# Altium footprint library Sajad_Altium_Library.PcbLib: 380 footprints (part 15 of 24)
Each footprint in its own frame and in the unit in brackets; x right, y up, seen from the top. Pads: shape width x height; smd on the part's side, far side on the other; paste and mask are expansions set on the pad; w line width, h text height; cw(c..) or ccw(c..) is an arc to the next point about the centre after c.
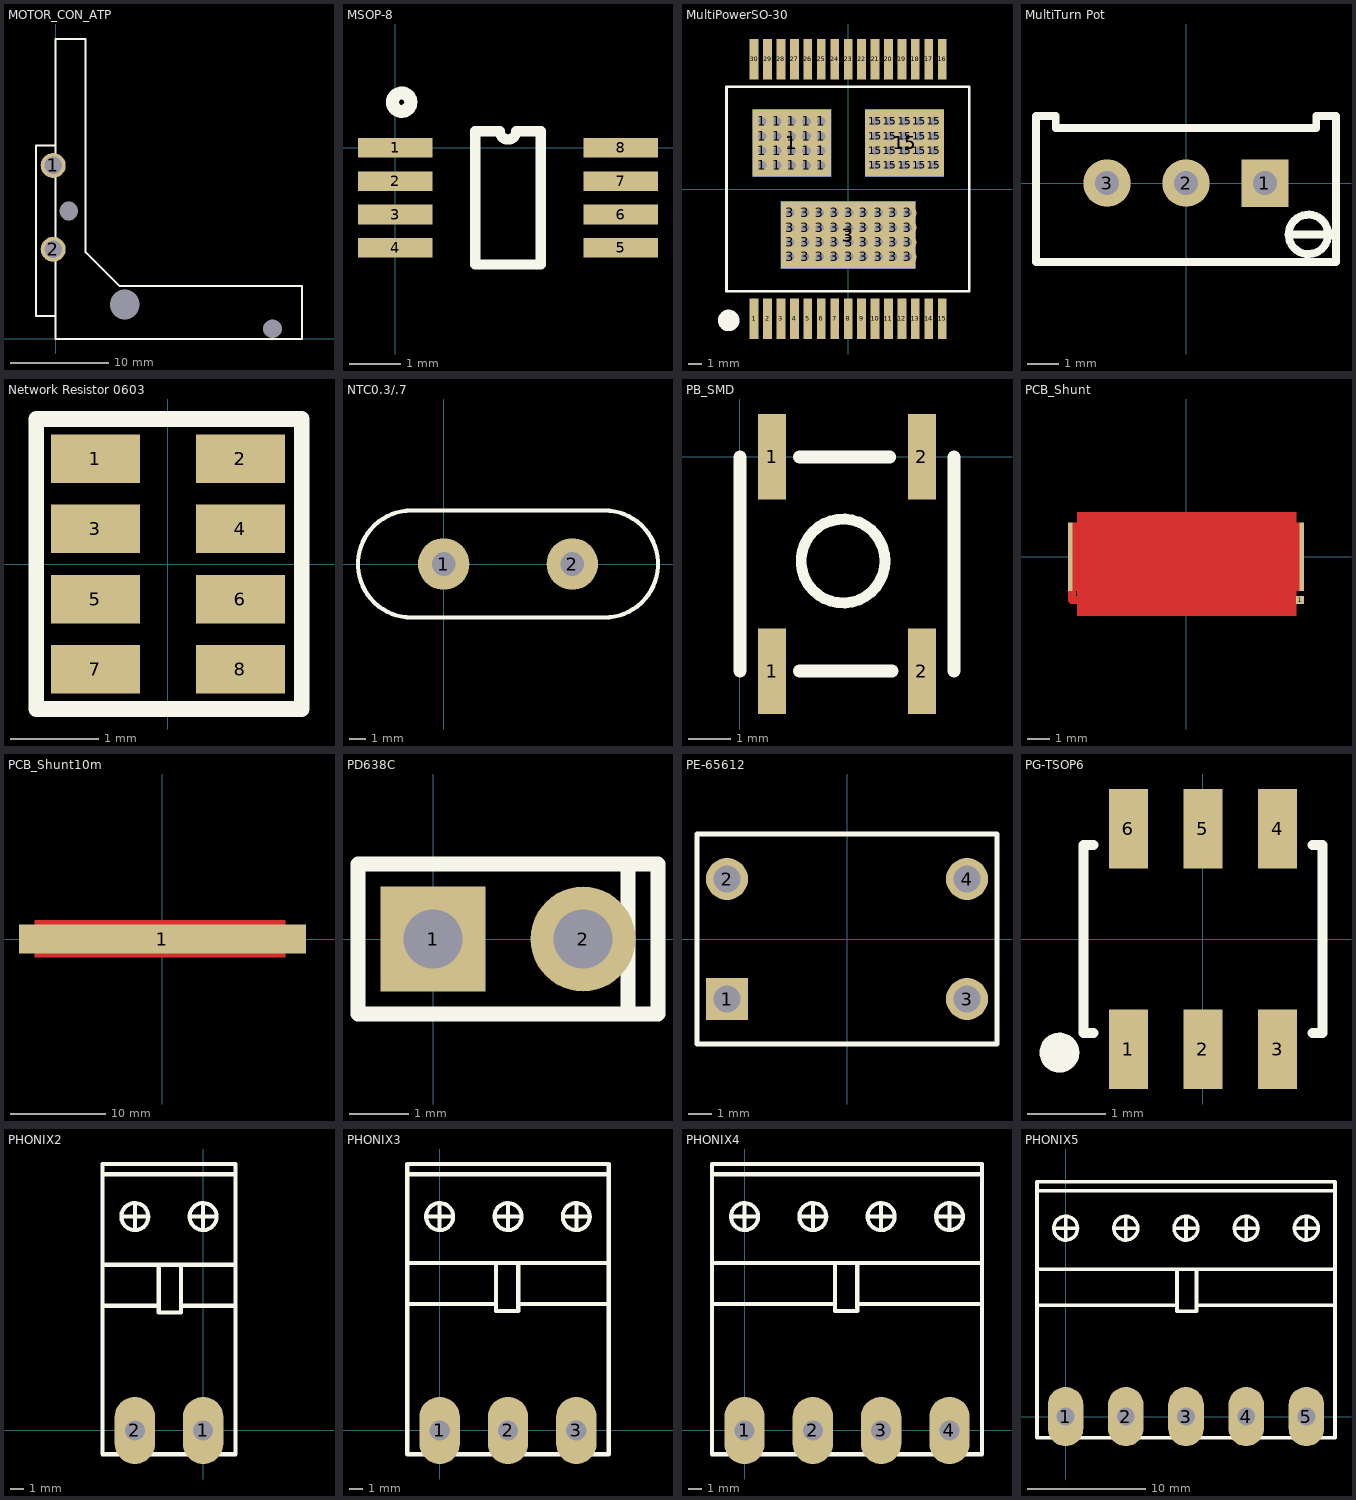
[diagram p14: the footprints below, top view; thin cyan lines are the x and y axes]

## MOTOR_CON_ATP [mm]
pads (5):
  round 0 hole 1.905: 0(1.326,12.975) 0(21.998,1.041)
  round 0 hole 3: 0(7.001,3.5)
  round 2.54 hole 1.778: 1(-0.246,17.6) 2(-0.246,9.1)
Top Overlay:
  lines w0.2: 0.001,2.35 -1.999,2.35 -1.999,19.65 0.001,19.65 ; 23.266,0 23.272,0.006 ; 0.001,0 25.001,0 25.001,5.38 6.457,5.38 3.051,8.786 3.051,30.429 0.001,30.429 0.001,0
3D body: height 16.32, standoff -2.58, extent -0.659,-0.086 25.141,30.414

## MSOP-8 [mil]
pads (8):
  rect 57x15 smd: 1(0,0) 2(0,-25.59) 3(0,-51.18) 4(0,-76.77) 5(173.23,-76.77) 6(173.23,-51.18) 7(173.23,-25.59) 8(173.23,0)
Top Overlay:
  circle w10: c5,35 r7.07
  lines w7.87: 61.42,-89.57 111.81,-89.57 111.81,12.8 93.01,12.8 cw(c86.61,12.8) 80.22,12.8 61.42,12.8 61.42,-89.57

## MultiPowerSO-30 [mil]
pads (112):
  rect 25.59x118.11 smd: 1(-275.59,-380.24) 2(-236.22,-380.24) 3(-196.85,-380.24) 4(-157.48,-380.24) 5(-118.11,-380.24) 6(-78.74,-380.24) 7(-39.37,-380.24) 8(0,-380.24) 9(39.37,-380.24) 10(78.74,-380.24) 11(118.11,-380.24) 12(157.48,-380.24) 13(196.85,-380.24) 14(236.22,-380.24) 15(275.59,-380.24) 16(275.59,380.24) 17(236.22,380.24) 18(196.85,380.24) 19(157.48,380.24) 20(118.11,380.24) 21(78.74,380.24) 22(39.37,380.24) 23(0,380.24) 24(-39.37,380.24) 25(-78.74,380.24) 26(-118.11,380.24) 27(-157.48,380.24) 28(-196.85,380.24) 29(-236.22,380.24) 30(-275.59,380.24)
  round 50 hole 25: 1(-251,69) 1(-251,112) 1(-251,155) 1(-251,198) 1(-208,69) 1(-208,112) 1(-208,155) 1(-208,198) 1(-165,69) 1(-165,112) 1(-165,155) 1(-165,198) 1(-122,69) 1(-122,112) 1(-122,155) 1(-122,198) 1(-79,69) 1(-79,112) 1(-79,155) 1(-79,198) 3(-169,-199) 3(-169,-156) 3(-169,-113) 3(-169,-70) 3(-126,-199) 3(-126,-156) 3(-126,-113) 3(-126,-70) 3(-83,-199) 3(-83,-156) 3(-83,-113) 3(-83,-70) 3(-40,-199) 3(-40,-156) 3(-40,-113) 3(-40,-70) 3(3,-199) 3(3,-156) 3(3,-113) 3(3,-70) 3(46,-199) 3(46,-156) 3(46,-113) 3(46,-70) 3(89,-199) 3(89,-156) 3(89,-113) 3(89,-70) 3(132,-199) 3(132,-156) 3(132,-113) 3(132,-70) 3(175,-199) 3(175,-156) 3(175,-113) 3(175,-70) 15(79,69) 15(79,112) 15(79,155) 15(79,198) 15(122,69) 15(122,112) 15(122,155) 15(122,198) 15(165,69) 15(165,112) 15(165,155) 15(165,198) 15(208,69) 15(208,112) 15(208,155) 15(208,198) 15(251,69) 15(251,112) 15(251,155) 15(251,198)
  rect 230.31x196.85 smd: 1(-165,135) 15(165,135)
  rect 230.31x196.85 smd far side: 1(-165,135) 15(165,135)
  rect 393.7x196.85 smd: 3(0,-135)
  rect 393.7x196.85 smd far side: 3(0,-135)
Top Overlay:
  circle w39.37: c-350,-385 r11.81
  lines w7.87: -356.45,-299.8 -356.45,299.8 ; -355.98,-299.8 355,-299.8 355,299.8 -355.98,299.8
3D body: height 93.41, standoff -3.69, extent -339.33,-374.02 337.84,374.02

## MultiTurn Pot [mil] "MultiTurn Potentiometer"
pads (3):
  rect 60x60 hole 30: 1(100,0)
  round 60 hole 30: 2(0,0) 3(-100,0)
Top Overlay:
  circle w10: c155,-65 r25
  lines w10: 130,-65 175,-65 ; -190,-100 -190,85 -165,85 -165,70 0,70 165,70 165,85 190,85 190,-100 -190,-100
3D body: height 454.72, standoff -251.97, extent -187.6,-100.2 187.6,90

## Network Resistor 0603 [mm]
pads (8):
  rect 1.016x0.55 smd: 1(-0.825,1.2) 2(0.826,1.2) 3(-0.825,0.4) 4(0.826,0.4) 5(-0.825,-0.4) 6(0.826,-0.4) 7(-0.825,-1.2) 8(0.826,-1.2)
Top Overlay:
  lines w0.178: -1.499,-1.651 -1.499,1.651 1.524,1.651 1.524,-1.651 -1.499,-1.651
3D body: height 0.55, standoff 0, extent -0.8,-1.651 0.8,1.549

## NTC0.3/.7 [mil]
pads (2):
  round 120 hole 55: 1(0,0) 2(300,0)
Top Overlay:
  lines w10: -75,-125 cw(c-75,0) -75,125 375,125 cw(c375,0) 375,-125 -75,-125

## PB_SMD [mm]
pads (4):
  rect 0.65x2 smd: 1(0.75,-5) 1(0.75,0) 2(4.25,-5) 2(4.25,0)
Top Overlay:
  circle w0.254: c2.408,-2.431 r0.979
  lines w0.3: 0,-5 0,0 ; 1.393,-5 3.551,-5 ; 1.393,0 3.496,0 ; 5,-5 5,0

## PCB_Shunt [mm] "3miliOhm"
pads (3):
  rect 0.2x3 smd paste-0.1 mask-0.1: 1(-5.08,0) 2(5.08,0)
  rect 0.356x0.356 smd paste-0.1 mask-0.1: 1(5.002,-1.905)
Top Layer:
  rectangle: -5.004,-1.499 4.996,1.501
  pour cut-out: -4.775,1.956 -4.775,-2.591 4.839,-2.591 4.839,1.956
  lines w0.356: -5.004,-1.499 -5.004,-1.905 4.826,-1.905

## PCB_Shunt10m [mm] "10miliOhm"
pads (2):
  rect 30x3 smd paste-3 mask-3: 1(0,0)
  rect 0.2x3 smd paste-0.1 mask-0.1: 2(14.859,0)
Top Layer:
  pour cut-out: -13.335,1.956 -13.335,-1.905 12.827,-1.905 12.827,1.956

## PD638C [mil] "2.75 ×5.25 mm Silicon PIN Photodiode"
pads (2):
  rect 70x70 hole 39.37: 1(0,0)
  round 70 hole 39.37: 2(100,0)
Top Overlay:
  lines w10: 130,-50 130,50 ; -50,-50 150,-50 150,50 -50,50 -50,-50
3D body: height 350, standoff -350, extent -42.4,-65 132.4,57.64

## PE-65612 [mil] "TRANSFORMERS FOR DIGITAL  AUDIO DATA TRANSMISSION"
pads (4):
  rect 70x70 hole 45: 1(-200,-100)
  round 70 hole 45: 2(-200,100) 3(200,-100) 4(200,100)
Top Overlay:
  lines w8: -250,-175 -250,175 250,175 250,-175 -250,-175
3D body: height 307.09, standoff -161.42, extent -250,-200.79 250,200.79

## PG-TSOP6 [mm]
pads (6):
  rect 0.5x1.016 smd: 1(-0.95,-1.403) 2(0,-1.403) 3(0.95,-1.403) 4(0.95,1.403) 5(0,1.403) 6(-0.95,1.403)
Top Overlay:
  circle w0.254: c-1.829,-1.448 r0.127
  lines w0.127: -1.397,-1.2 -1.524,-1.2 -1.524,0 -1.524,1.2 -1.397,1.2 ; 1.397,-1.2 1.524,-1.2 1.524,0 1.524,1.2 1.397,1.2
3D body: height 1.3, standoff 0, extent -1.5,-1.5 1.5,1.5

## PHONIX2 [mm]
pads (2):
  oval 3x5 hole 1.5: 1(0,0) 2(-5.08,0)
Top Overlay:
  circle w0.3: c-5.08,15.9 r1.006
  circle w0.3: c0,15.9 r1.006
  lines w0.3: -7.366,19.05 2.413,19.05 ; -5.944,15.9 -4.242,15.9 ; -5.08,15.062 -5.08,16.688 ; -0.864,15.9 0.838,15.9 ; 0,15.062 0,16.688
  lines w0.305: -7.493,9.271 -3.302,9.271 ; -7.493,12.319 2.413,12.319 ; -3.302,12.192 -3.302,8.763 -1.651,8.763 -1.651,12.319 ; -1.651,9.271 2.413,9.271 ; 2.337,-1.778 -7.493,-1.778 -7.493,19.812 2.413,19.812 2.413,-1.778

## PHONIX3 [mm]
pads (3):
  oval 3x5 hole 1.5: 1(0,0) 2(5.08,0) 3(10.16,0)
Top Overlay:
  circle w0.3: c10.16,15.9 r1.006
  circle w0.3: c0,15.9 r1.006
  circle w0.3: c5.08,15.9 r1.006
  lines w0.3: -2.286,19.05 12.573,19.05 ; -0.864,15.9 0.838,15.9 ; 0,15.062 0,16.688 ; 4.216,15.9 5.918,15.9 ; 5.08,15.062 5.08,16.688 ; 9.296,15.9 10.998,15.9 ; 10.16,15.062 10.16,16.688
  lines w0.305: -2.413,9.398 4.191,9.398 ; -2.413,12.446 12.573,12.446 ; 4.191,12.319 4.191,8.89 5.842,8.89 5.842,12.446 ; 5.842,9.398 12.573,9.398 ; -2.413,-1.778 12.573,-1.778 12.573,19.812 -2.413,19.812 -2.413,-1.778

## PHONIX4 [mm]
pads (4):
  oval 3x5 hole 1.5: 1(0,0) 2(5.08,0) 3(10.16,0) 4(15.24,0)
Top Overlay:
  circle w0.3: c15.24,15.9 r1.006
  circle w0.3: c10.16,15.9 r1.006
  circle w0.3: c0,15.9 r1.006
  circle w0.3: c5.08,15.9 r1.006
  lines w0.3: -2.286,19.05 17.653,19.05 ; -0.864,15.9 0.838,15.9 ; 0,15.062 0,16.688 ; 4.216,15.9 5.918,15.9 ; 5.08,15.062 5.08,16.688 ; 9.296,15.9 10.998,15.9 ; 10.16,15.062 10.16,16.688 ; 14.376,15.9 16.078,15.9 ; 15.24,15.062 15.24,16.688
  lines w0.305: -2.413,9.398 6.731,9.398 ; -2.413,12.446 17.653,12.446 ; 6.731,12.319 6.731,8.89 8.382,8.89 8.382,12.446 ; 8.382,9.398 17.653,9.398 ; -2.413,-1.778 17.653,-1.778 17.653,19.812 -2.413,19.812 -2.413,-1.778

## PHONIX5 [mm]
pads (5):
  oval 3x5 hole 1.5: 1(0,0) 2(5.08,0) 3(10.16,0) 4(15.24,0) 5(20.32,0)
Top Overlay:
  circle w0.3: c15.24,15.9 r1.006
  circle w0.3: c10.16,15.9 r1.006
  circle w0.3: c0,15.9 r1.006
  circle w0.3: c5.08,15.9 r1.006
  circle w0.3: c20.32,15.9 r1.006
  lines w0.3: -2.286,19.05 22.733,19.05 ; -0.864,15.9 0.838,15.9 ; 0,15.062 0,16.688 ; 4.216,15.9 5.918,15.9 ; 5.08,15.062 5.08,16.688 ; 9.296,15.9 10.998,15.9 ; 10.16,15.062 10.16,16.688 ; 14.376,15.9 16.078,15.9 ; 15.24,15.062 15.24,16.688 ; 19.456,15.9 21.158,15.9 ; 20.32,15.062 20.32,16.688
  lines w0.305: -2.413,9.398 9.398,9.398 ; -2.413,12.446 22.733,12.446 ; 9.398,12.319 9.398,8.89 11.049,8.89 11.049,12.446 ; 11.049,9.398 22.733,9.398 ; -2.413,-1.778 22.733,-1.778 22.733,19.812 -2.413,19.812 -2.413,-1.778